# Altium footprint library MyPcb.PcbLib: 367 footprints (part 20 of 23)
Each footprint in its own frame and in the unit in brackets; x right, y up, seen from the top. Pads: shape width x height; smd on the part's side, far side on the other; paste and mask are expansions set on the pad; w line width, h text height; cw(c..) or ccw(c..) is an arc to the next point about the centre after c.
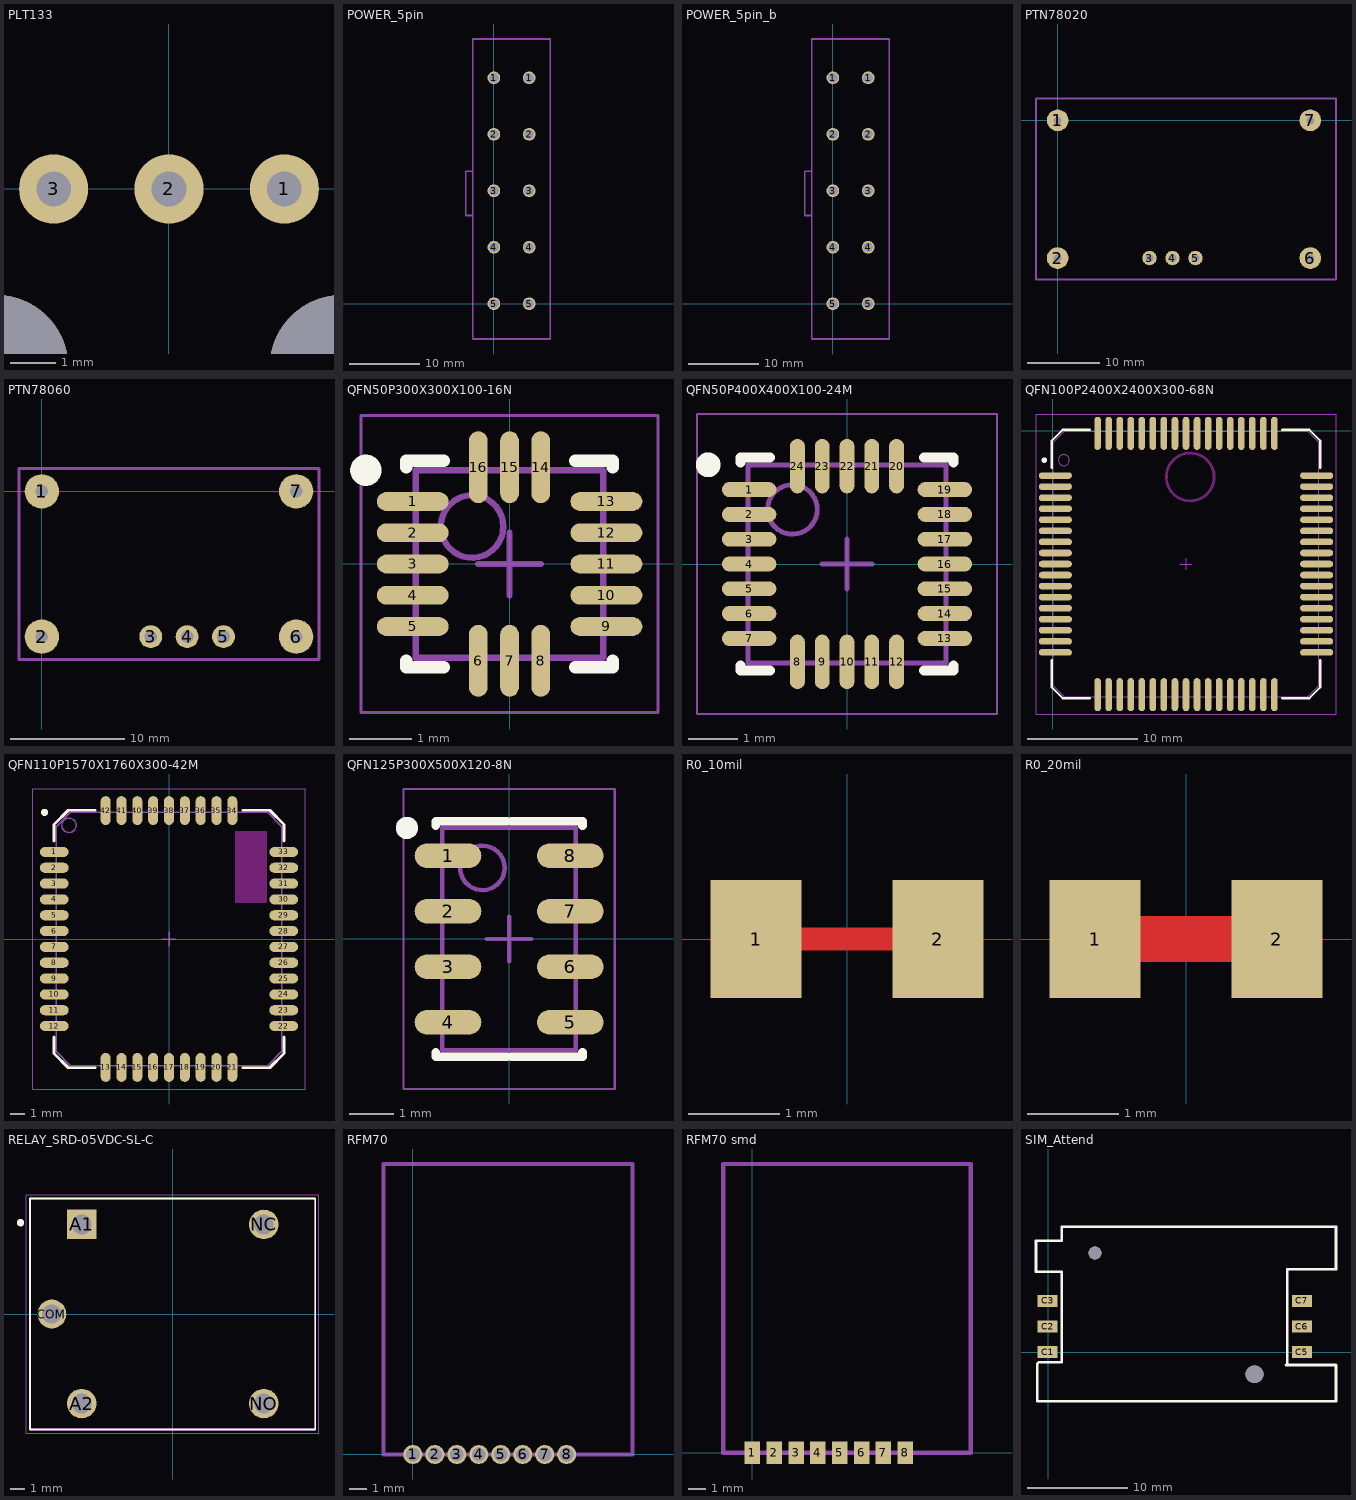
[diagram p19: the footprints below, top view; thin cyan lines are the x and y axes]

## PLT133 [mil] "Optical transmitter"
height 787.4
pads (3):
  round 60 hole 30: 1(100,0) 2(0,0) 3(-100,0)
via 150,-155 diameter 125.98 hole 125.98
via -150,-155 diameter 125.98 hole 125.98

## POWER_5pin [mm]
pads (10):
  round 1.8 hole 1.4: 1(0,32) 1(5,32) 2(0,24) 2(5,24) 3(0,16) 3(5,16) 4(0,8) 4(5,8) 5(0,0) 5(5,0)
Mechanical 1:
  lines w0.254: -3,12.5 -4,12.5 -4,18.75 -3,18.75 ; -3,-5 -3,37.5 8,37.5 8,-5 -3,-5

## POWER_5pin_b [mm]
pads (10):
  round 1.8 hole 1.4: 1(0,32) 1(5,32) 2(0,24) 2(5,24) 3(0,16) 3(5,16) 4(0,8) 4(5,8) 5(0,0) 5(5,0)
Mechanical 1:
  lines w0.254: -3,12.5 -4,12.5 -4,18.75 -3,18.75 ; -3,-5 -3,37.5 8,37.5 8,-5 -3,-5

## PTN78020 [mm]
height 9
pads (7):
  round 3 hole 1.1: 1(0,0) 2(0,-19.05) 6(34.94,-19.05) 7(34.94,0)
  round 2 hole 1.1: 3(12.7,-19.05) 4(15.88,-19.05) 5(19.06,-19.05)
Mechanical 1:
  lines w0.254: -3,-22 38.5,-22 38.5,3 -3,3 -3,-22

## PTN78060 [mm]
height 9
pads (7):
  round 3 hole 1.1: 1(0,0) 2(0,-12.7) 6(22.23,-12.7) 7(22.23,0)
  round 2 hole 1.1: 3(9.52,-12.7) 4(12.7,-12.7) 5(15.88,-12.7)
Mechanical 1:
  lines w0.254: -2,-14.7 24.23,-14.7 24.23,2 -2,2 -2,-14.7

## QFN50P300X300X100-16N [mm] "QFN, 16-Leads, Body 3,00x3,00mm, Pitch 0,50mm, IPC Medium Density"
height 1
pads (16):
  oval 1.15x0.3 smd: 1(-1.55,1) 2(-1.55,0.5) 3(-1.55,0) 4(-1.55,-0.5) 5(-1.55,-1) 9(1.55,-1) 10(1.55,-0.5) 11(1.55,0) 12(1.55,0.5) 13(1.55,1)
  oval 0.3x1.15 smd: 6(-0.5,-1.55) 7(0,-1.55) 8(0.5,-1.55) 14(0.5,1.55) 15(0,1.55) 16(-0.5,1.55)
Top Overlay:
  circle w0.25: c-2.3,1.5 r0.125
  lines w0.2: -1.65,-1.55 -1.65,-1.65 -1.05,-1.65 ; -1.65,1.55 -1.65,1.65 -1.05,1.65 ; 1.05,-1.65 1.65,-1.65 1.65,-1.55 ; 1.05,1.65 1.65,1.65 1.65,1.55
Mechanical 13:
  circle w0.1: c-0.6,0.6 r0.5
  lines w0.1: -1.5,-1.5 1.5,-1.5 1.5,1.5 -1.5,1.5 -1.5,-1.5
Mechanical 15:
  lines w0.05: -2.375,-2.375 2.375,-2.375 2.375,2.375 -2.375,2.375 -2.375,-2.375
  lines w0.1: -0.5,0 0.5,0 ; 0,-0.5 0,0.5
3D body: height 1, standoff 0.01, extent -1.5,-1.5 1.5,1.5

## QFN50P400X400X100-24M [mm] "QFN, 24-Leads, Body 4,00x4,00mm, Pitch 0,50mm, IPC Low Density"
height 1
pads (24):
  oval 1.1x0.3 smd: 1(-1.975,1.5) 2(-1.975,1) 3(-1.975,0.5) 4(-1.975,0) 5(-1.975,-0.5) 6(-1.975,-1) 7(-1.975,-1.5) 13(1.975,-1.5) 14(1.975,-1) 15(1.975,-0.5) 16(1.975,0) 17(1.975,0.5) 18(1.975,1) 19(1.975,1.5)
  oval 0.3x1.1 smd: 8(-1,-1.975) 9(-0.5,-1.975) 10(0,-1.975) 11(0.5,-1.975) 12(1,-1.975) 20(1,1.975) 21(0.5,1.975) 22(0,1.975) 23(-0.5,1.975) 24(-1,1.975)
Top Overlay:
  circle w0.25: c-2.8,2 r0.125
  lines w0.2: -2.15,-2.05 -2.15,-2.15 -1.55,-2.15 ; -2.15,2.05 -2.15,2.15 -1.55,2.15 ; 1.55,-2.15 2.15,-2.15 2.15,-2.05 ; 1.55,2.15 2.15,2.15 2.15,2.05
Mechanical 13:
  circle w0.1: c-1.1,1.1 r0.5
  lines w0.1: -2,-2 -2,2 2,2 2,-2 -2,-2
Mechanical 15:
  lines w0.05: -3.025,-3.025 -3.025,3.025 3.025,3.025 3.025,-3.025 -3.025,-3.025
  lines w0.1: -0.5,0 0.5,0 ; 0,-0.5 0,0.5
3D body: height 1, standoff 0.01, extent -2,-2 2,2

## QFN100P2400X2400X300-68N [mm] "QFN, 68-Leads, Body 24,00x24,00mm, Pitch 1,00mm, IPC Medium Density"
height 3
pads (68):
  oval 3x0.6 smd: 1(0.24,-4.065) 2(0.24,-5.065) 3(0.24,-6.065) 4(0.24,-7.065) 5(0.24,-8.065) 6(0.24,-9.065) 7(0.24,-10.065) 8(0.24,-11.065) 9(0.24,-12.065) 10(0.24,-13.065) 11(0.24,-14.065) 12(0.24,-15.065) 13(0.24,-16.065) 14(0.24,-17.065) 15(0.24,-18.065) 16(0.24,-19.065) 17(0.24,-20.065) 35(23.89,-20.065) 36(23.89,-19.065) 37(23.89,-18.065) 38(23.89,-17.065) 39(23.89,-16.065) 40(23.89,-15.065) 41(23.89,-14.065) 42(23.89,-13.065) 43(23.89,-12.065) 44(23.89,-11.065) 45(23.89,-10.065) 46(23.89,-9.065) 47(23.89,-8.065) 48(23.89,-7.065) 49(23.89,-6.065) 50(23.89,-5.065) 51(23.89,-4.065)
  oval 0.6x3 smd: 18(4.065,-23.89) 19(5.065,-23.89) 20(6.065,-23.89) 21(7.065,-23.89) 22(8.065,-23.89) 23(9.065,-23.89) 24(10.065,-23.89) 25(11.065,-23.89) 26(12.065,-23.89) 27(13.065,-23.89) 28(14.065,-23.89) 29(15.065,-23.89) 30(16.065,-23.89) 31(17.065,-23.89) 32(18.065,-23.89) 33(19.065,-23.89) 34(20.065,-23.89) 52(20.065,-0.24) 53(19.065,-0.24) 54(18.065,-0.24) 55(17.065,-0.24) 56(16.065,-0.24) 57(15.065,-0.24) 58(14.065,-0.24) 59(13.065,-0.24) 60(12.065,-0.24) 61(11.065,-0.24) 62(10.065,-0.24) 63(9.065,-0.24) 64(8.065,-0.24) 65(7.065,-0.24) 66(6.065,-0.24) 67(5.065,-0.24) 68(4.065,-0.24)
Top Overlay:
  circle w0.25: c-0.762,-2.667 r0.125
  lines w0.2: -0.085,-20.765 -0.085,-23.215 0.915,-24.215 3.365,-24.215 ; -0.085,-3.365 -0.085,-0.915 0.915,0.085 3.365,0.085 ; 20.765,-24.215 23.215,-24.215 24.215,-23.215 24.215,-20.765 ; 20.765,0.085 23.215,0.085 24.215,-0.915 24.215,-3.365
Keep-Out Layer:
  circle w0.254: c12.446,-4.191 r2.163
Mechanical 13:
  circle w0.1: c1.016,-2.667 r0.5
  lines w0.1: 0.065,-23.065 0.065,-1.065 1.065,-0.065 23.065,-0.065 24.065,-1.065 24.065,-23.065 23.065,-24.065 1.065,-24.065 0.065,-23.065
Mechanical 15:
  lines w0.05: -1.51,-25.64 25.64,-25.64 25.64,1.51 -1.51,1.51 -1.51,-25.64
  lines w0.1: 11.565,-12.065 12.565,-12.065 ; 12.065,-12.565 12.065,-11.565
3D body: height 3, standoff 0.01, extent 0.065,-24.065 24.065,-0.065

## QFN110P1570X1760X300-42M [mm] "QFN, 42-Leads, Body 15,70x17,60mm, Pitch 1,10mm, IPC Low Density"
height 3
pads (42):
  oval 2x0.7 smd: 1(-7.975,6.05) 2(-7.975,4.95) 3(-7.975,3.85) 4(-7.975,2.75) 5(-7.975,1.65) 6(-7.975,0.55) 7(-7.975,-0.55) 8(-7.975,-1.65) 9(-7.975,-2.75) 10(-7.975,-3.85) 11(-7.975,-4.95) 12(-7.975,-6.05) 22(7.975,-6.05) 23(7.975,-4.95) 24(7.975,-3.85) 25(7.975,-2.75) 26(7.975,-1.65) 27(7.975,-0.55) 28(7.975,0.55) 29(7.975,1.65) 30(7.975,2.75) 31(7.975,3.85) 32(7.975,4.95) 33(7.975,6.05)
  oval 0.7x2 smd: 13(-4.4,-8.925) 14(-3.3,-8.925) 15(-2.2,-8.925) 16(-1.1,-8.925) 17(0,-8.925) 18(1.1,-8.925) 19(2.2,-8.925) 20(3.3,-8.925) 21(4.4,-8.925) 34(4.4,8.925) 35(3.3,8.925) 36(2.2,8.925) 37(1.1,8.925) 38(0,8.925) 39(-1.1,8.925) 40(-2.2,8.925) 41(-3.3,8.925) 42(-4.4,8.925)
Top Overlay:
  circle w0.25: c-8.65,8.8 r0.125
  lines w0.2: -8,-6.8 -8,-7.95 -7,-8.95 -5.15,-8.95 ; -8,6.8 -8,7.95 -7,8.95 -5.15,8.95 ; 5.15,-8.95 7,-8.95 8,-7.95 8,-6.8 ; 5.15,8.95 7,8.95 8,7.95 8,6.8
Keep-Out Layer:
  rectangle: 4.6,2.5 6.8,7.5
Mechanical 13:
  circle w0.1: c-6.95,7.9 r0.5
  lines w0.1: -7.85,-7.8 -6.85,-8.8 6.85,-8.8 7.85,-7.8 7.85,7.8 6.85,8.8 -6.85,8.8 -7.85,7.8 -7.85,-7.8
Mechanical 15:
  lines w0.05: -9.475,-10.425 -9.475,10.425 9.475,10.425 9.475,-10.425 -9.475,-10.425
  lines w0.1: -0.5,0 0.5,0 ; 0,-0.5 0,0.5
3D body: height 3, standoff 0.01, extent -7.85,-8.8 7.85,8.8

## QFN125P300X500X120-8N [mm] "QFN, 8-Leads, Body 3,00x5,00mm, Pitch 1,25mm, IPC Medium Density"
height 1.2
pads (8):
  oval 1.5x0.55 smd: 1(-1.375,1.875) 2(-1.375,0.625) 3(-1.375,-0.625) 4(-1.375,-1.875) 5(1.375,-1.875) 6(1.375,-0.625) 7(1.375,0.625) 8(1.375,1.875)
Top Overlay:
  circle w0.25: c-2.3,2.5 r0.125
  lines w0.2: -1.65,-2.55 -1.65,-2.65 -0.05,-2.65 ; -1.65,2.55 -1.65,2.65 -0.05,2.65 ; 0.05,-2.65 1.65,-2.65 1.65,-2.55 ; 0.05,2.65 1.65,2.65 1.65,2.55
Mechanical 13:
  circle w0.1: c-0.6,1.6 r0.5
  lines w0.1: -1.5,-2.5 1.5,-2.5 1.5,2.5 -1.5,2.5 -1.5,-2.5
Mechanical 15:
  lines w0.05: -2.375,-3.375 2.375,-3.375 2.375,3.375 -2.375,3.375 -2.375,-3.375
  lines w0.1: -0.5,0 0.5,0 ; 0,-0.5 0,0.5
3D body: height 1.2, standoff 0.01, extent -1.5,-2.5 1.5,2.5

## R0_10mil [mm] "0805 0R"
height 0.5
pads (2):
  rect 1x1.3 smd: 1(-1,0) 2(1,0)
Top Layer:
  lines w0.254: -1,0 1,0
3D body "0805RES.STEP": height 0.62, standoff 0.02, extent -1,-0.625 1,0.625

## R0_20mil [mm] "0805 0R"
height 0.5
pads (2):
  rect 1x1.3 smd: 1(-1,0) 2(1,0)
Top Layer:
  lines w0.508: -1,0 1,0
3D body "0805RES.STEP": height 0.62, standoff 0.02, extent -1,-0.625 1,0.625

## RELAY_SRD-05VDC-SL-C [mm]
pads (5):
  rect 1.98x1.98 hole 1.32: A1(-6.1,6)
  round 1.98 hole 1.32: A2(-6.1,-6) NC(6.1,6) NO(6.1,-6)
  round 1.935 hole 1.29: COM(-8.1,0)
Top Overlay:
  circle w0.3: c-10.2,6.119 r0.1
  lines w0.127: -9.55,-7.75 -9.55,7.75 9.55,7.75 9.55,-7.75 -9.55,-7.75
Mechanical 13:
  lines w0.127: -9.55,-7.75 -9.55,7.75 9.55,7.75 9.55,-7.75 -9.55,-7.75
Mechanical 15:
  lines w0.05: -9.8,-8 -9.8,8 9.8,8 9.8,-8 -9.8,-8

## RFM70 [mm]
pads (8):
  round 1.1 hole 0.8: 1(0,0) 2(1.27,0) 3(2.54,0) 4(3.81,0) 5(5.08,0) 6(6.35,0) 7(7.62,0) 8(8.89,0)
Mechanical 1:
  lines w0.254: -1.7,0 -1.7,16.8 12.7,16.8 12.7,0 -1.7,0

## RFM70 smd [mm]
pads (8):
  rect 0.9x1.3 smd: 1(0,0) 2(1.27,0) 3(2.54,0) 4(3.81,0) 5(5.08,0) 6(6.35,0) 7(7.62,0) 8(8.89,0)
Mechanical 1:
  lines w0.254: -1.7,0 12.7,0 12.7,16.8 -1.7,16.8 -1.7,0

## SIM_Attend [mm]
pads (6):
  rect 2x1.2 smd: C1(-0.053,0.031) C2(-0.053,2.571) C3(-0.053,5.111) C5(25.147,0.031) C6(25.147,2.571) C7(25.147,5.111)
via 4.647,9.841 diameter 1.3 hole 1.3
via 20.447,-2.159 diameter 1.75 hole 1.75
Top Overlay:
  lines w0.254: -1.196,8.001 -1.196,11.08 1.344,11.08 1.344,12.446 28.522,12.446 28.522,8.255 23.696,8.255 23.696,-1.112 23.569,-1.239 28.522,-1.239 28.522,-4.826 -1.069,-4.826 -1.069,-1.112 -0.942,-0.985 1.344,-0.985 1.344,8.001 -1.196,8.001